# Altium footprint library PHOENIX THD.PcbLib: 109 footprints (part 4 of 8)
Each footprint in its own frame and in the unit in brackets; x right, y up, seen from the top. Pads: shape width x height; smd on the part's side, far side on the other; paste and mask are expansions set on the pad; w line width, h text height; cw(c..) or ccw(c..) is an arc to the next point about the centre after c.
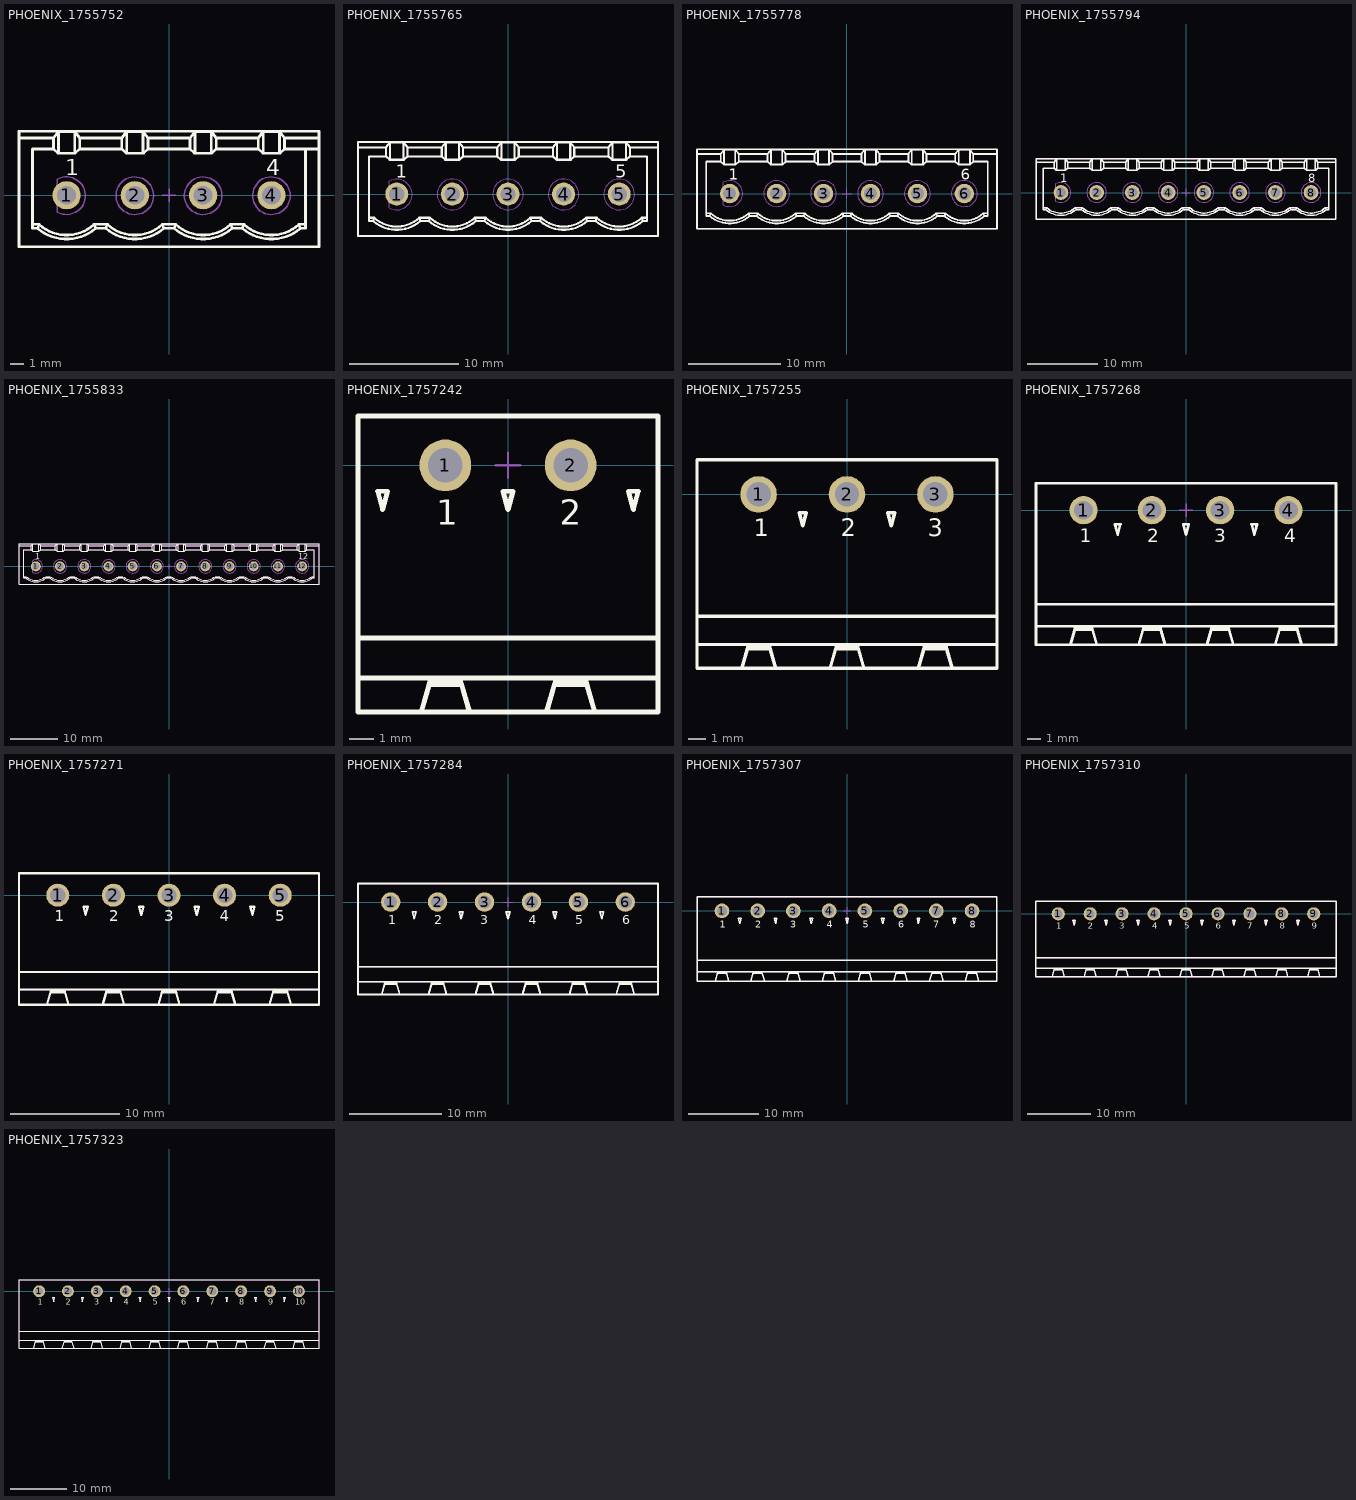
[diagram p3: the footprints below, top view; thin cyan lines are the x and y axes]

## PHOENIX_1755752 [mm] "PCB Header, 12A 250 V, Pitch: 2.54mm, 4 Positions, MSTBVA Serie"
height 12
pads (4):
  round 2.1 hole 1.4: 1(-7.62,0) 2(-2.54,0) 3(2.54,0) 4(7.62,0)
Top Overlay:
  lines w0.2: -11.16,4.265 -8.595,4.265 ; -10.16,-2.165 -9.66,-2.165 ; -8.225,3.128 -8.225,4.738 ; -7.015,3.128 -7.015,4.738 ; -3.145,3.128 -3.145,4.738 ; -1.935,3.128 -1.935,4.738 ; 1.935,3.128 1.935,4.738 ; 3.145,3.128 3.145,4.738 ; 7.015,3.128 7.015,4.738 ; 8.225,3.128 8.225,4.738 ; 10.16,-2.165 9.66,-2.165 ; 10.16,3.44 10.16,-2.465 9.774,-2.465 ; 11.16,3.44 8.595,3.44 ; 11.16,4.265 8.595,4.265 ; -9.774,-2.465 ccw(c-7.62,0.036) -5.466,-2.465 ; -9.774,-2.465 -9.66,-2.165 ; -9.774,-2.465 -10.16,-2.465 -10.16,3.44 -8.595,3.44 ; -9.66,-2.165 ccw(c-7.62,0.033) -5.58,-2.165 ; -8.595,3.44 -8.264,3.128 -6.976,3.128 -6.645,3.44 ; -8.595,3.44 -8.595,4.265 ; -8.595,4.265 -8.225,4.738 ; -8.225,4.738 -7.015,4.738 ; -7.015,4.738 -6.645,4.265 ; -6.645,3.44 -6.645,4.265 ; -6.645,3.44 -3.515,3.44 ; -6.645,4.265 -3.515,4.265 ; -5.58,-2.165 -4.58,-2.165 ; -5.58,-2.165 -5.466,-2.465 ; -5.466,-2.465 -4.694,-2.465 ; -4.694,-2.465 ccw(c-2.54,0.036) -0.386,-2.465 ; -4.694,-2.465 -4.58,-2.165 ; -4.58,-2.165 ccw(c-2.54,0.033) -0.5,-2.165 ; -3.515,3.44 -3.515,4.265 ; -3.515,3.44 -3.184,3.128 -1.896,3.128 -1.565,3.44 ; -3.515,4.265 -3.145,4.738 ; -3.145,4.738 -1.935,4.738 ; -1.935,4.738 -1.565,4.265 ; -1.565,3.44 1.565,3.44 ; -1.565,3.44 -1.565,4.265 ; -1.565,4.265 1.565,4.265 ; -0.5,-2.165 0.5,-2.165 ; -0.5,-2.165 -0.386,-2.465 ; -0.386,-2.465 0.386,-2.465 ; 0.386,-2.465 ccw(c2.54,0.036) 4.694,-2.465 ; 0.386,-2.465 0.5,-2.165 ; 0.5,-2.165 ccw(c2.54,0.033) 4.58,-2.165 ; 1.565,3.44 1.565,4.265 ; 1.565,3.44 1.896,3.128 3.184,3.128 3.515,3.44 ; 1.565,4.265 1.935,4.738 ; 1.935,4.738 3.145,4.738 ; 3.145,4.738 3.515,4.265 ; 3.515,3.44 6.645,3.44 ; 3.515,3.44 3.515,4.265 ; 3.515,4.265 6.645,4.265 ; 4.58,-2.165 5.58,-2.165 ; 4.58,-2.165 4.694,-2.465 ; 4.694,-2.465 5.466,-2.465 ; 5.466,-2.465 ccw(c7.62,0.036) 9.774,-2.465 ; 5.466,-2.465 5.58,-2.165 ; 5.58,-2.165 ccw(c7.62,0.033) 9.66,-2.165 ; 6.645,3.44 6.645,4.265 ; 6.645,3.44 6.976,3.128 8.264,3.128 8.595,3.44 ; 6.645,4.265 7.015,4.738 ; 7.015,4.738 8.225,4.738 ; 8.225,4.738 8.595,4.265 ; 8.595,3.44 8.595,4.265 ; 9.66,-2.165 9.774,-2.465 ; -11.16,-3.835 -11.16,4.765 11.16,4.765 11.16,-3.835 -11.16,-3.835
  text "1" at -7.73,1.485 h1.2
  text "4" at 7.235,1.485 h1.2
Mechanical 8:
  lines w0.1: -3.04,0 -2.54,0 ; -2.54,-0.5 -2.54,0 ; -2.54,0.5 -2.54,0 ; -2.04,0 -2.54,0 ; -0.5,0 0,0 ; 0,-0.5 0,0 ; 0,0.5 0,0 ; 0.5,0 0,0 ; 2.04,0 2.54,0 ; 2.54,-0.5 2.54,0 ; 2.54,0.5 2.54,0 ; 3.04,0 2.54,0 ; 7.12,0 7.62,0 ; 7.62,-0.5 7.62,0 ; 7.62,0.5 7.62,0 ; 8.12,0 7.62,0 ; -7.62,0 -8.12,0 -7.62,0 ; -7.62,0 -7.62,-0.5 -7.62,0 ; -7.62,0 -7.12,0 -7.62,0 ; -7.62,0 -7.62,0.5 -7.62,0
Mechanical 14:
  circle w0.1: c7.62,-0.035 r1.4
  circle w0.1: c2.54,-0.035 r1.4
  circle w0.1: c-2.54,-0.035 r1.4
  lines w0.1: -11.16,4.265 -8.595,4.265 ; -10.16,-2.165 -9.66,-2.165 ; -8.225,3.128 -8.225,4.738 ; -7.015,3.128 -7.015,4.738 ; -3.145,3.128 -3.145,4.738 ; -1.935,3.128 -1.935,4.738 ; 1.935,3.128 1.935,4.738 ; 3.145,3.128 3.145,4.738 ; 7.015,3.128 7.015,4.738 ; 8.225,3.128 8.225,4.738 ; 10.16,-2.165 9.66,-2.165 ; 10.16,3.44 10.16,-2.465 9.774,-2.465 ; 11.16,3.44 8.595,3.44 ; 11.16,4.265 8.595,4.265 ; -9.774,-2.465 ccw(c-7.62,0.036) -5.466,-2.465 ; -9.774,-2.465 -9.66,-2.165 ; -9.774,-2.465 -10.16,-2.465 -10.16,3.44 -8.595,3.44 ; -9.66,-2.165 ccw(c-7.62,0.033) -5.58,-2.165 ; -8.595,3.44 -8.264,3.128 -6.976,3.128 -6.645,3.44 ; -8.595,3.44 -8.595,4.265 ; -8.595,4.265 -8.225,4.738 ; -8.225,4.738 -7.015,4.738 ; -8.12,-0.535 -7.852,-0.267 ; -8.12,-0.535 -8.12,0.465 ; -8.12,-0.535 -7.12,-0.535 ; -8.12,0.465 -7.852,0.197 ; -8.12,0.465 -7.12,0.465 ; -7.852,-0.267 -7.852,0.197 ; -7.852,-0.267 -7.388,-0.267 ; -7.852,0.197 -7.388,0.197 ; -7.388,-0.267 -7.388,0.197 ; -7.388,-0.267 -7.12,-0.535 ; -7.388,0.197 -7.12,0.465 ; -7.12,-0.535 -7.12,0.465 ; -7.015,4.738 -6.645,4.265 ; -6.645,3.44 -6.645,4.265 ; -6.645,3.44 -3.515,3.44 ; -6.645,4.265 -3.515,4.265 ; -5.58,-2.165 -4.58,-2.165 ; -5.58,-2.165 -5.466,-2.465 ; -5.466,-2.465 -4.694,-2.465 ; -4.694,-2.465 ccw(c-2.54,0.036) -0.386,-2.465 ; -4.694,-2.465 -4.58,-2.165 ; -4.58,-2.165 ccw(c-2.54,0.033) -0.5,-2.165 ; -3.515,3.44 -3.515,4.265 ; -3.515,3.44 -3.184,3.128 -1.896,3.128 -1.565,3.44 ; -3.515,4.265 -3.145,4.738 ; -3.145,4.738 -1.935,4.738 ; -3.04,-0.535 -2.772,-0.267 ; -3.04,-0.535 -3.04,0.465 ; -3.04,-0.535 -2.04,-0.535 ; -3.04,0.465 -2.772,0.197 ; -3.04,0.465 -2.04,0.465 ; -2.772,-0.267 -2.772,0.197 ; -2.772,-0.267 -2.308,-0.267 ; -2.772,0.197 -2.308,0.197 ; -2.308,-0.267 -2.308,0.197 ; -2.308,-0.267 -2.04,-0.535 ; -2.308,0.197 -2.04,0.465 ; -2.04,-0.535 -2.04,0.465 ; -1.935,4.738 -1.565,4.265 ; -1.565,3.44 1.565,3.44 ; -1.565,3.44 -1.565,4.265 ; -1.565,4.265 1.565,4.265 ; -0.5,-2.165 0.5,-2.165 ; -0.5,-2.165 -0.386,-2.465 ; -0.386,-2.465 0.386,-2.465 ; 0.386,-2.465 ccw(c2.54,0.036) 4.694,-2.465 ; 0.386,-2.465 0.5,-2.165 ; 0.5,-2.165 ccw(c2.54,0.033) 4.58,-2.165 ; 1.565,3.44 1.565,4.265 ; 1.565,3.44 1.896,3.128 3.184,3.128 3.515,3.44 ; 1.565,4.265 1.935,4.738 ; 1.935,4.738 3.145,4.738 ; 2.04,-0.535 2.308,-0.267 ; 2.04,-0.535 2.04,0.465 ; 2.04,-0.535 3.04,-0.535 ; 2.04,0.465 2.308,0.197 ; 2.04,0.465 3.04,0.465 ; 2.308,-0.267 2.308,0.197 ; 2.308,-0.267 2.772,-0.267 ; 2.308,0.197 2.772,0.197 ; 2.772,-0.267 2.772,0.197 ; 2.772,-0.267 3.04,-0.535 ; 2.772,0.197 3.04,0.465 ; 3.04,-0.535 3.04,0.465 ; 3.145,4.738 3.515,4.265 ; 3.515,3.44 6.645,3.44 ; 3.515,3.44 3.515,4.265 ; 3.515,4.265 6.645,4.265 ; 4.58,-2.165 5.58,-2.165 ; 4.58,-2.165 4.694,-2.465 ; 4.694,-2.465 5.466,-2.465 ; 5.466,-2.465 ccw(c7.62,0.036) 9.774,-2.465 ; 5.466,-2.465 5.58,-2.165 ; 5.58,-2.165 ccw(c7.62,0.033) 9.66,-2.165 ; 6.645,3.44 6.645,4.265 ; 6.645,3.44 6.976,3.128 8.264,3.128 8.595,3.44 ; 6.645,4.265 7.015,4.738 ; 7.015,4.738 8.225,4.738 ; 7.12,-0.535 7.388,-0.267 ; 7.12,-0.535 7.12,0.465 ; 7.12,-0.535 8.12,-0.535 ; 7.12,0.465 7.388,0.197 ; 7.12,0.465 8.12,0.465 ; 7.388,-0.267 7.388,0.197 ; 7.388,-0.267 7.852,-0.267 ; 7.388,0.197 7.852,0.197 ; 7.852,-0.267 7.852,0.197 ; 7.852,-0.267 8.12,-0.535 ; 7.852,0.197 8.12,0.465 ; 8.12,-0.535 8.12,0.465 ; 8.225,4.738 8.595,4.265 ; 8.595,3.44 8.595,4.265 ; 9.66,-2.165 9.774,-2.465 ; -11.16,-3.835 -11.16,4.765 11.16,4.765 11.16,-3.835 -11.16,-3.835 ; -8.32,-1.247 ccw(c-7.62,-0.035) -8.32,1.177 -8.32,-1.247
  text "1" at -7.73,1.485 h1.2
  text "4" at 7.235,1.485 h1.2
3D body "PHOENIX_1755752.stp": height 12, standoff -3.9, extent -11.16,-3.835 11.16,4.765

## PHOENIX_1755765 [mm] "PCB Header, 12A 250 V, Pitch: 2.54mm, 5 Positions, MSTBVA Serie"
height 12
pads (5):
  round 2.1 hole 1.4: 1(-10.16,0) 2(-5.08,0) 3(0,0) 4(5.08,0) 5(10.16,0)
Top Overlay:
  lines w0.2: -13.7,4.265 -11.135,4.265 ; -12.7,-2.165 -12.2,-2.165 ; -10.765,3.128 -10.765,4.738 ; -9.555,3.128 -9.555,4.738 ; -5.685,3.128 -5.685,4.738 ; -4.475,3.128 -4.475,4.738 ; -0.605,3.128 -0.605,4.738 ; 0.605,3.128 0.605,4.738 ; 4.475,3.128 4.475,4.738 ; 5.685,3.128 5.685,4.738 ; 9.555,3.128 9.555,4.738 ; 10.765,3.128 10.765,4.738 ; 12.7,-2.165 12.2,-2.165 ; 13.7,4.265 11.135,4.265 ; -12.314,-2.465 ccw(c-10.16,0.036) -8.006,-2.465 ; -12.314,-2.465 -12.7,-2.465 -12.7,3.44 -11.135,3.44 ; -12.314,-2.465 -12.2,-2.165 ; -12.2,-2.165 ccw(c-10.16,0.033) -8.12,-2.165 ; -11.135,3.44 -11.135,4.265 ; -11.135,3.44 -10.804,3.128 -9.516,3.128 -9.185,3.44 ; -11.135,4.265 -10.765,4.738 ; -10.765,4.738 -9.555,4.738 ; -9.555,4.738 -9.185,4.265 ; -9.185,3.44 -6.055,3.44 ; -9.185,3.44 -9.185,4.265 ; -9.185,4.265 -6.055,4.265 ; -8.12,-2.165 -8.006,-2.465 ; -8.12,-2.165 -7.12,-2.165 ; -8.006,-2.465 -7.234,-2.465 ; -7.234,-2.465 ccw(c-5.08,0.036) -2.926,-2.465 ; -7.234,-2.465 -7.12,-2.165 ; -7.12,-2.165 ccw(c-5.08,0.033) -3.04,-2.165 ; -6.055,3.44 -5.724,3.128 -4.436,3.128 -4.105,3.44 ; -6.055,3.44 -6.055,4.265 ; -6.055,4.265 -5.685,4.738 ; -5.685,4.738 -4.475,4.738 ; -4.475,4.738 -4.105,4.265 ; -4.105,3.44 -4.105,4.265 ; -4.105,3.44 -0.975,3.44 ; -4.105,4.265 -0.975,4.265 ; -3.04,-2.165 -2.926,-2.465 ; -3.04,-2.165 -2.04,-2.165 ; -2.926,-2.465 -2.154,-2.465 ; -2.154,-2.465 ccw(c0,0.036) 2.154,-2.465 ; -2.154,-2.465 -2.04,-2.165 ; -2.04,-2.165 ccw(c0,0.033) 2.04,-2.165 ; -0.975,3.44 -0.644,3.128 0.644,3.128 0.975,3.44 ; -0.975,3.44 -0.975,4.265 ; -0.975,4.265 -0.605,4.738 ; -0.605,4.738 0.605,4.738 ; 0.605,4.738 0.975,4.265 ; 0.975,3.44 0.975,4.265 ; 0.975,3.44 4.105,3.44 ; 0.975,4.265 4.105,4.265 ; 2.04,-2.165 2.154,-2.465 ; 2.04,-2.165 3.04,-2.165 ; 2.154,-2.465 2.926,-2.465 ; 2.926,-2.465 ccw(c5.08,0.036) 7.234,-2.465 ; 2.926,-2.465 3.04,-2.165 ; 3.04,-2.165 ccw(c5.08,0.033) 7.12,-2.165 ; 4.105,3.44 4.436,3.128 5.724,3.128 6.055,3.44 ; 4.105,3.44 4.105,4.265 ; 4.105,4.265 4.475,4.738 ; 4.475,4.738 5.685,4.738 ; 5.685,4.738 6.055,4.265 ; 6.055,3.44 6.055,4.265 ; 6.055,3.44 9.185,3.44 ; 6.055,4.265 9.185,4.265 ; 7.12,-2.165 7.234,-2.465 ; 7.12,-2.165 8.12,-2.165 ; 7.234,-2.465 8.006,-2.465 ; 8.006,-2.465 ccw(c10.16,0.036) 12.314,-2.465 ; 8.006,-2.465 8.12,-2.165 ; 8.12,-2.165 ccw(c10.16,0.033) 12.2,-2.165 ; 9.185,3.44 9.516,3.128 10.804,3.128 11.135,3.44 ; 9.185,3.44 9.185,4.265 ; 9.185,4.265 9.555,4.738 ; 9.555,4.738 10.765,4.738 ; 10.765,4.738 11.135,4.265 ; 11.135,3.44 11.135,4.265 ; 11.135,3.44 12.7,3.44 12.7,-2.465 12.314,-2.465 ; 12.2,-2.165 12.314,-2.465 ; -13.7,-3.835 13.7,-3.835 13.7,4.765 -13.7,4.765 -13.7,-3.835
  text "1" at -10.27,1.485 h1.2
  text "5" at 9.775,1.485 h1.2
Mechanical 8:
  lines w0.1: -10.66,0 -10.16,0 ; -10.16,-0.5 -10.16,0 ; -10.16,0.5 -10.16,0 ; -9.66,0 -10.16,0 ; -5.58,0 -5.08,0 ; -5.08,-0.5 -5.08,0 ; -5.08,0.5 -5.08,0 ; -4.58,0 -5.08,0 ; 4.58,0 5.08,0 ; 5.08,-0.5 5.08,0 ; 5.08,0.5 5.08,0 ; 5.58,0 5.08,0 ; 9.66,0 10.16,0 ; 10.16,-0.5 10.16,0 ; 10.16,0.5 10.16,0 ; 10.66,0 10.16,0 ; 0,0 0,0.5 0,0 ; 0,0 0.5,0 0,0 ; 0,0 0,-0.5 0,0 ; 0,0 -0.5,0 0,0
Mechanical 14:
  drawing of 166 lines, arcs and shapes, not listed
  text "1" at -10.27,1.485 h1.2
  text "5" at 9.775,1.485 h1.2
3D body "PHOENIX_1755765.stp": height 12, standoff -3.9, extent -13.7,-3.835 13.7,4.765

## PHOENIX_1755778 [mm] "PCB Header, 12A 250 V, Pitch: 2.54mm, 6 Positions, MSTBVA Serie"
height 12
pads (6):
  round 2.1 hole 1.4: 1(-12.7,0) 2(-7.62,0) 3(-2.54,0) 4(2.54,0) 5(7.62,0) 6(12.7,0)
Top Overlay:
  lines w0.2: -16.24,4.3 -13.675,4.3 ; -15.24,-2.13 -14.74,-2.13 ; -13.305,3.163 -13.305,4.773 ; -12.095,3.163 -12.095,4.773 ; -10.546,-2.43 -10.66,-2.13 ; -9.774,-2.43 ccw(c-7.62,0.071) -5.466,-2.43 -5.58,-2.13 ; -8.225,3.163 -8.225,4.773 ; -7.015,3.163 -7.015,4.773 ; -5.466,-2.43 -4.694,-2.43 -4.58,-2.13 ; -4.694,-2.43 ccw(c-2.54,0.071) -0.386,-2.43 -0.5,-2.13 ; -3.145,3.163 -3.145,4.773 ; -1.935,3.163 -1.935,4.773 ; -0.386,-2.43 0.386,-2.43 0.5,-2.13 ; 0.386,-2.43 ccw(c2.54,0.071) 4.694,-2.43 4.58,-2.13 ; 1.935,3.163 1.935,4.773 ; 3.145,3.163 3.145,4.773 ; 4.694,-2.43 5.466,-2.43 5.58,-2.13 ; 5.466,-2.43 ccw(c7.62,0.071) 9.774,-2.43 9.66,-2.13 ; 9.774,-2.43 10.546,-2.43 10.66,-2.13 ; 10.546,-2.43 ccw(c12.7,0.071) 14.854,-2.43 ; 12.095,3.163 12.095,4.773 ; 13.305,3.163 13.305,4.773 ; 15.24,-2.13 14.74,-2.13 ; 16.24,4.3 13.675,4.3 ; -14.854,-2.43 ccw(c-12.7,0.071) -10.546,-2.43 -9.774,-2.43 -9.66,-2.13 ; -14.854,-2.43 -14.74,-2.13 ; -14.854,-2.43 -15.24,-2.43 -15.24,3.475 -13.675,3.475 ; -14.74,-2.13 ccw(c-12.7,0.068) -10.66,-2.13 ; -13.675,3.475 -13.344,3.163 -12.056,3.163 -11.725,3.475 ; -13.675,3.475 -13.675,4.3 ; -13.675,4.3 -13.305,4.773 ; -13.305,4.773 -12.095,4.773 ; -12.095,4.773 -11.725,4.3 ; -11.725,3.475 -11.725,4.3 ; -11.725,3.475 -8.595,3.475 ; -11.725,4.3 -8.595,4.3 ; -10.66,-2.13 -9.66,-2.13 ; -9.66,-2.13 ccw(c-7.62,0.068) -5.58,-2.13 ; -8.595,3.475 -8.595,4.3 ; -8.595,3.475 -8.264,3.163 -6.976,3.163 -6.645,3.475 ; -8.595,4.3 -8.225,4.773 ; -8.225,4.773 -7.015,4.773 ; -7.015,4.773 -6.645,4.3 ; -6.645,3.475 -3.515,3.475 ; -6.645,3.475 -6.645,4.3 ; -6.645,4.3 -3.515,4.3 ; -5.58,-2.13 -4.58,-2.13 ; -4.58,-2.13 ccw(c-2.54,0.068) -0.5,-2.13 ; -3.515,3.475 -3.515,4.3 ; -3.515,3.475 -3.184,3.163 -1.896,3.163 -1.565,3.475 ; -3.515,4.3 -3.145,4.773 ; -3.145,4.773 -1.935,4.773 ; -1.935,4.773 -1.565,4.3 ; -1.565,3.475 1.565,3.475 ; -1.565,3.475 -1.565,4.3 ; -1.565,4.3 1.565,4.3 ; -0.5,-2.13 0.5,-2.13 ; 0.5,-2.13 ccw(c2.54,0.068) 4.58,-2.13 ; 1.565,3.475 1.565,4.3 ; 1.565,3.475 1.896,3.163 3.184,3.163 3.515,3.475 ; 1.565,4.3 1.935,4.773 ; 1.935,4.773 3.145,4.773 ; 3.145,4.773 3.515,4.3 ; 3.515,3.475 6.645,3.475 ; 3.515,3.475 3.515,4.3 ; 3.515,4.3 6.645,4.3 ; 4.58,-2.13 5.58,-2.13 ; 5.58,-2.13 ccw(c7.62,0.068) 9.66,-2.13 ; 6.645,3.475 6.645,4.3 ; 6.645,3.475 6.976,3.163 ; 6.645,3.475 6.976,3.163 ; 6.645,3.475 6.645,4.3 ; 6.645,4.3 7.015,4.773 ; 6.645,4.3 7.015,4.773 ; 6.976,3.163 8.264,3.163 ; 6.976,3.163 8.264,3.163 ; 7.015,4.773 7.015,3.163 7.015,4.773 ; 7.015,4.773 8.225,4.773 ; 7.015,4.773 8.225,4.773 ; 8.225,4.773 8.225,3.163 8.225,4.773 ; 8.225,4.773 8.595,4.3 ; 8.225,4.773 8.595,4.3 ; 8.264,3.163 8.595,3.475 ; 8.264,3.163 8.595,3.475 ; 8.595,3.475 11.725,3.475 ; 8.595,3.475 8.595,4.3 ; 8.595,3.475 8.595,4.3 ; 8.595,4.3 11.725,4.3 ; 9.66,-2.13 10.66,-2.13 ; 10.661,-2.13 ccw(c12.7,0.068) 14.74,-2.13 ; 11.725,3.475 11.725,4.3 ; 11.725,3.475 12.056,3.163 13.344,3.163 13.675,3.475 ; 11.725,4.3 12.095,4.773 ; 12.095,4.773 13.305,4.773 ; 13.305,4.773 13.675,4.3 ; 13.675,3.475 15.24,3.475 15.24,-2.43 14.854,-2.43 ; 13.675,3.475 13.675,4.3 ; 14.74,-2.13 14.854,-2.43 ; -16.24,-3.8 -16.24,4.8 16.24,4.8 16.24,-3.8 -16.24,-3.8
  text "6" at 12.315,1.485 h1.2
  text "1" at -12.81,1.485 h1.2
Mechanical 8:
  lines w0.1: -13.2,0 -12.7,0 ; -12.7,-0.5 -12.7,0 ; -12.7,0.5 -12.7,0 ; -12.2,0 -12.7,0 ; -8.12,0 -7.62,0 ; -7.62,-0.5 -7.62,0 ; -7.62,0.5 -7.62,0 ; -7.12,0 -7.62,0 ; -3.04,0 -2.54,0 ; -2.54,-0.5 -2.54,0 ; -2.54,0.5 -2.54,0 ; -2.04,0 -2.54,0 ; -0.5,0 0,0 ; 0,-0.5 0,0 ; 0,0.5 0,0 ; 0.5,0 0,0 ; 2.04,0 2.54,0 ; 2.54,-0.5 2.54,0 ; 2.54,0.5 2.54,0 ; 3.04,0 2.54,0 ; 7.12,0 7.62,0 ; 7.62,-0.5 7.62,0 ; 7.62,0.5 7.62,0 ; 8.12,0 7.62,0 ; 12.2,0 12.7,0 ; 12.7,-0.5 12.7,0 ; 12.7,0.5 12.7,0 ; 13.2,0 12.7,0
Mechanical 14:
  drawing of 207 lines, arcs and shapes, not listed
  text "6" at 12.315,1.485 h1.2
  text "1" at -12.81,1.485 h1.2
3D body "PHOENIX_1755778.stp": height 12, standoff -3.9, extent -16.24,-3.8 16.24,4.8

## PHOENIX_1755794 [mm] "PCB Header, 12A 250 V, Pitch: 5.08mm, 8 Positions, MSTBVA Serie"
height 12
pads (8):
  round 2.1 hole 1.4: 1(-17.78,0) 2(-12.7,0) 3(-7.62,0) 4(-2.54,0) 5(2.54,0) 6(7.62,0) 7(12.7,0) 8(17.78,0)
Top Overlay:
  drawing of 154 lines, arcs and shapes, not listed
  text "8" at 17.395,1.485 h1.2
  text "1" at -17.89,1.485 h1.2
Mechanical 8:
  lines w0.1: -18.28,0 -17.78,0 ; -17.78,-0.5 -17.78,0 ; -17.78,0.5 -17.78,0 ; -17.28,0 -17.78,0 ; -13.2,0 -12.7,0 ; -12.7,-0.5 -12.7,0 ; -12.7,0.5 -12.7,0 ; -12.2,0 -12.7,0 ; -8.12,0 -7.62,0 ; -7.62,-0.5 -7.62,0 ; -7.62,0.5 -7.62,0 ; -7.12,0 -7.62,0 ; -3.04,0 -2.54,0 ; -2.54,-0.5 -2.54,0 ; -2.54,0.5 -2.54,0 ; -2.04,0 -2.54,0 ; -0.5,0 0,0 ; 0,-0.5 0,0 ; 0,0.5 0,0 ; 0.5,0 0,0 ; 2.04,0 2.54,0 ; 2.54,-0.5 2.54,0 ; 2.54,0.5 2.54,0 ; 3.04,0 2.54,0 ; 7.12,0 7.62,0 ; 7.62,-0.5 7.62,0 ; 7.62,0.5 7.62,0 ; 8.12,0 7.62,0 ; 12.2,0 12.7,0 ; 12.7,-0.5 12.7,0 ; 12.7,0.5 12.7,0 ; 13.2,0 12.7,0 ; 17.28,0 17.78,0 ; 17.78,-0.5 17.78,0 ; 17.78,0.5 17.78,0 ; 18.28,0 17.78,0
Mechanical 14:
  drawing of 259 lines, arcs and shapes, not listed
  text "8" at 17.395,1.485 h1.2
  text "1" at -17.89,1.485 h1.2
3D body "PHOENIX_1755794.stp": height 12, standoff -3.9, extent -21.32,-3.8 21.32,4.8

## PHOENIX_1755833 [mm] "PCB Header, 12A 250 V, Pitch: 5.08mm, 12 Positions, MSTBVA Serie"
height 12
pads (12):
  round 2.1 hole 1.4: 1(-27.94,0) 2(-22.86,0) 3(-17.78,0) 4(-12.7,0) 5(-7.62,0) 6(-2.54,0) 7(2.54,0) 8(7.62,0) 9(12.7,0) 10(17.78,0) 11(22.86,0) 12(27.94,0)
Top Overlay:
  drawing of 226 lines, arcs and shapes, not listed
  text "1" at -28.05,1.485 h1.2
  text "12" at 27.13,1.485 h1.2
Mechanical 8:
  lines w0.1: -0.5,0 0,0 ; 0,-0.5 0,0 ; 0,0.5 0,0 ; 0.5,0 0,0 ; 12.2,0 12.7,0 ; 12.7,-0.5 12.7,0 ; 12.7,0.5 12.7,0 ; 13.2,0 12.7,0 ; 17.28,0 17.78,0 ; 17.78,-0.5 17.78,0 ; 17.78,0.5 17.78,0 ; 18.28,0 17.78,0 ; 22.36,0 22.86,0 ; 22.86,-0.5 22.86,0 ; 22.86,0.5 22.86,0 ; 23.36,0 22.86,0 ; 27.44,0 27.94,0 ; 27.94,-0.5 27.94,0 ; 27.94,0.5 27.94,0 ; 28.44,0 27.94,0 ; -27.94,0 -28.44,0 -27.94,0 ; -27.94,0 -27.94,0.5 -27.94,0 ; -27.94,0 -27.94,-0.5 -27.94,0 ; -27.94,0 -27.44,0 -27.94,0 ; -22.86,0 -23.36,0 -22.86,0 ; -22.86,0 -22.86,0.5 -22.86,0 ; -22.86,0 -22.86,-0.5 -22.86,0 ; -22.86,0 -22.36,0 -22.86,0 ; -17.78,0 -18.28,0 -17.78,0 ; -17.78,0 -17.78,0.5 -17.78,0 ; -17.78,0 -17.78,-0.5 -17.78,0 ; -17.78,0 -17.28,0 -17.78,0 ; -12.7,0 -13.2,0 -12.7,0 ; -12.7,0 -12.7,0.5 -12.7,0 ; -12.7,0 -12.7,-0.5 -12.7,0 ; -12.7,0 -12.2,0 -12.7,0 ; -7.62,0 -8.12,0 -7.62,0 ; -7.62,0 -7.62,0.5 -7.62,0 ; -7.62,0 -7.62,-0.5 -7.62,0 ; -7.62,0 -7.12,0 -7.62,0 ; -2.54,0 -3.04,0 -2.54,0 ; -2.54,0 -2.54,0.5 -2.54,0 ; -2.54,0 -2.54,-0.5 -2.54,0 ; -2.54,0 -2.04,0 -2.54,0 ; 2.54,0 2.04,0 2.54,0 ; 2.54,0 2.54,0.5 2.54,0 ; 2.54,0 2.54,-0.5 2.54,0 ; 2.54,0 3.04,0 2.54,0 ; 7.62,0 7.12,0 7.62,0 ; 7.62,0 7.62,0.5 7.62,0 ; 7.62,0 7.62,-0.5 7.62,0 ; 7.62,0 8.12,0 7.62,0
Mechanical 14:
  drawing of 383 lines, arcs and shapes, not listed
  text "1" at -28.05,1.485 h1.2
  text "1" at -28.05,1.485 h1.2
  text "12" at 27.13,1.485 h1.2
3D body "PHOENIX_1755833.stp": height 12, standoff -3.9, extent -31.48,-3.8 31.48,4.8

## PHOENIX_1757242 [mm] "PHOENIX MSTBA Serie, Pitch 5.08mm, 12A, 250V, 2 Positions Header"
height 8.6
pads (2):
  round 2.1 hole 1.4: 1(-2.54,0) 2(2.54,0)
Top Overlay:
  lines w0.2: -6.08,-8.626 6.08,-8.626 ; -6.08,-7 6.08,-7 ; -3.515,-10 -3.145,-8.7 -1.935,-8.7 -1.565,-10 ; -3.196,-8.88 -1.884,-8.88 ; -2.785,-8.7 -2.772,-8.75 -2.308,-8.75 -2.295,-8.7 ; 1.565,-10 1.935,-8.7 3.145,-8.7 3.515,-10 ; 1.884,-8.88 3.196,-8.88 ; 2.295,-8.7 2.308,-8.75 2.772,-8.75 2.785,-8.7 ; -6.08,-10 -6.08,2 6.08,2 6.08,-10 -6.08,-10 ; -5.281,-1.05 -4.879,-1.05 -5.08,-1.8 -5.281,-1.05 ; -0.201,-1.05 0.201,-1.05 0,-1.8 -0.201,-1.05 ; 4.879,-1.05 5.281,-1.05 5.08,-1.8 4.879,-1.05
  text "1" at -2.9,-2.4 h1
  text "2" at 2.1,-2.4 h1
Mechanical 8:
  lines w0.1: -3.04,0 -2.54,0 ; -2.54,-0.5 -2.54,0 ; -2.54,0.5 -2.54,0 ; -2.04,0 -2.54,0 ; -0.5,0 0,0 ; 0,-0.5 0,0 ; 0,0.5 0,0 ; 0.5,0 0,0 ; 2.04,0 2.54,0 ; 2.54,-0.5 2.54,0 ; 2.54,0.5 2.54,0 ; 3.04,0 2.54,0
Mechanical 14:
  lines w0.1: -6.08,-8.626 6.08,-8.626 ; -6.08,-7 6.08,-7 ; -3.515,-10 -3.145,-8.7 -1.935,-8.7 -1.565,-10 ; -3.196,-8.88 -1.884,-8.88 ; -2.785,-8.7 -2.772,-8.75 -2.308,-8.75 -2.295,-8.7 ; 1.565,-10 1.935,-8.7 3.145,-8.7 3.515,-10 ; 1.884,-8.88 3.196,-8.88 ; 2.295,-8.7 2.308,-8.75 2.772,-8.75 2.785,-8.7 ; -6.08,-10 -6.08,2 6.08,2 6.08,-10 -6.08,-10 ; -5.281,-1.05 -4.879,-1.05 -5.08,-1.8 -5.281,-1.05 ; -0.201,-1.05 0.201,-1.05 0,-1.8 -0.201,-1.05 ; 4.879,-1.05 5.281,-1.05 5.08,-1.8 4.879,-1.05
3D body "PHOENIX_1757242.stp": height 8.6, standoff -3, extent -6.08,-10 6.08,2.002
